# Altium footprint library Mi Libreria.PcbLib: 184 footprints (part 7 of 12)
Each footprint in its own frame and in the unit in brackets; x right, y up, seen from the top. Pads: shape width x height; smd on the part's side, far side on the other; paste and mask are expansions set on the pad; w line width, h text height; cw(c..) or ccw(c..) is an arc to the next point about the centre after c.
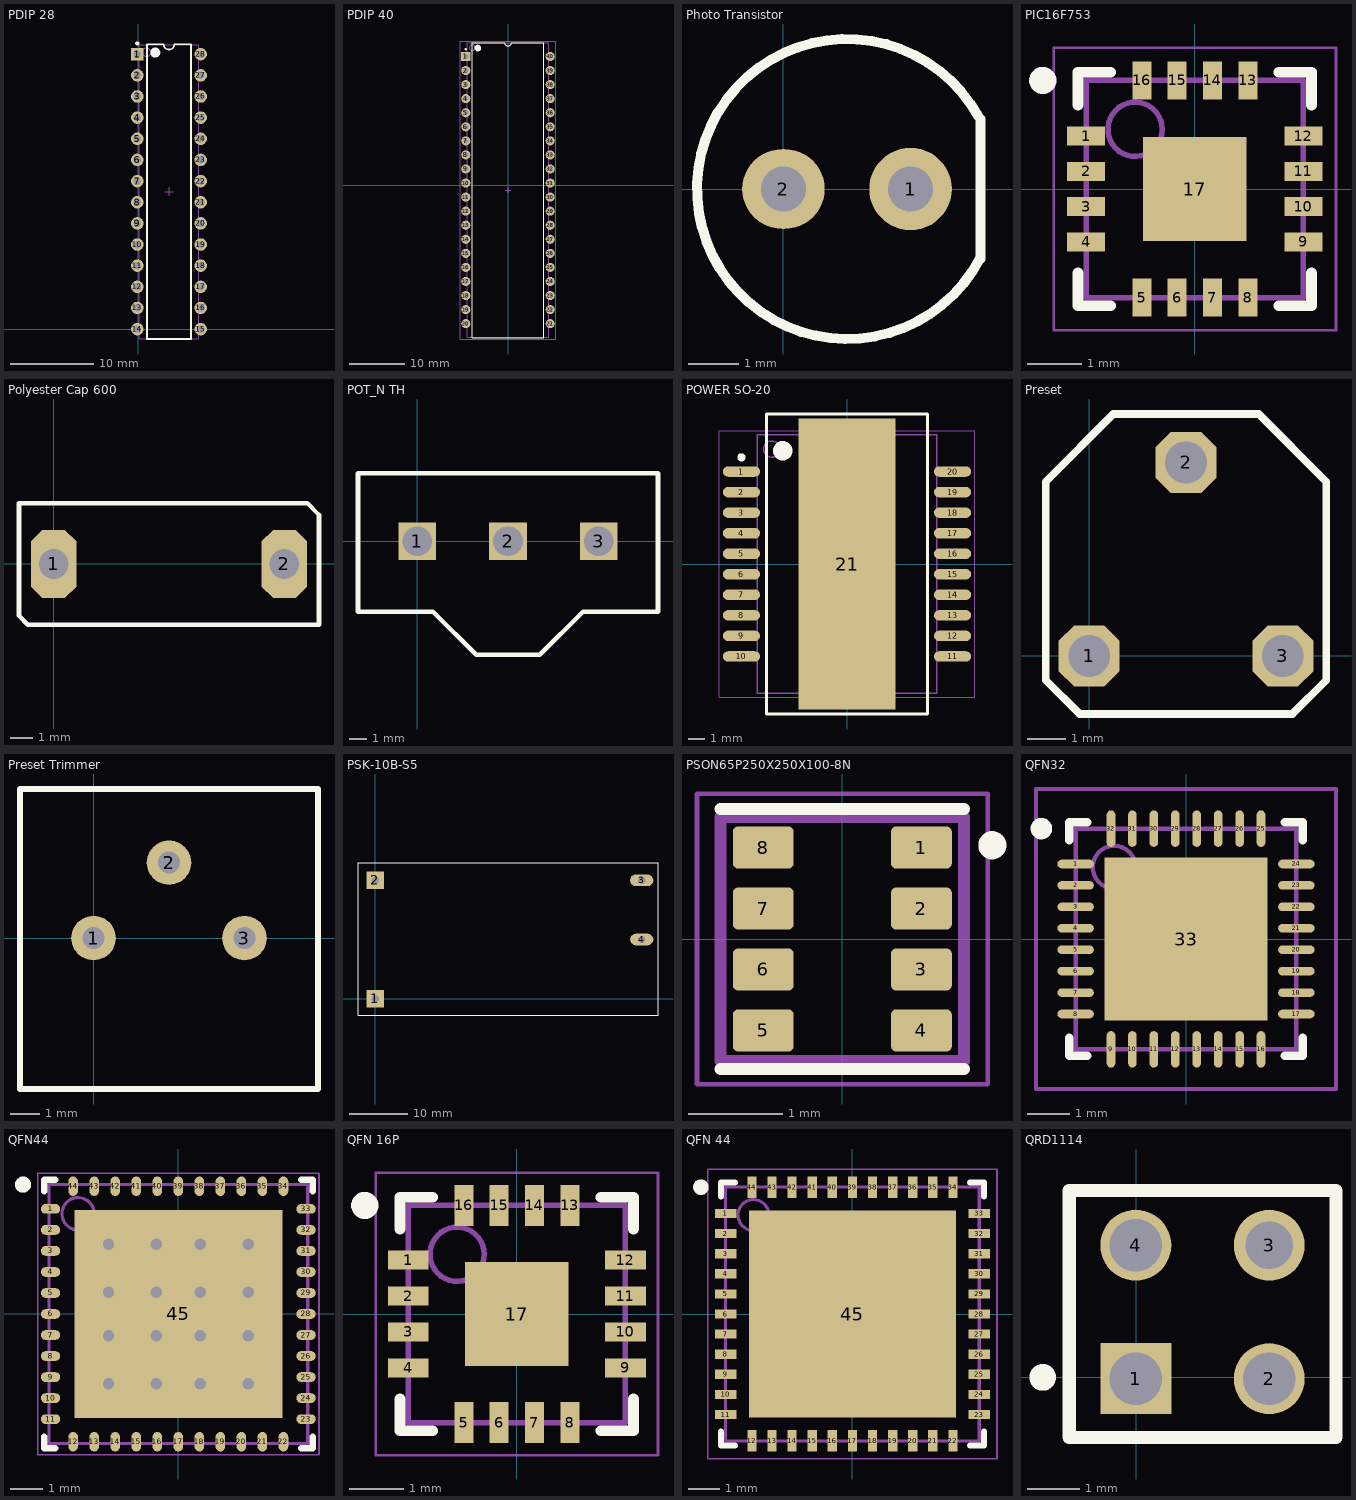
[diagram p6: the footprints below, top view; thin cyan lines are the x and y axes]

## PDIP 28 [mm] "PDIP 28 Through Hole"
pads (28):
  rect 1.5x1.5 hole 0.9: 1(-0.127,33.02)
  round 1.5 hole 0.9: 2(-0.127,30.48) 3(-0.127,27.94) 4(-0.127,25.4) 5(-0.127,22.86) 6(-0.127,20.32) 7(-0.127,17.78) 8(-0.127,15.24) 9(-0.127,12.7) 10(-0.127,10.16) 11(-0.127,7.62) 12(-0.127,5.08) 13(-0.127,2.54) 14(-0.127,0) 15(7.493,0) 16(7.493,2.54) 17(7.493,5.08) 18(7.493,7.62) 19(7.493,10.16) 20(7.493,12.7) 21(7.493,15.24) 22(7.493,17.78) 23(7.493,20.32) 24(7.493,22.86) 25(7.493,25.4) 26(7.493,27.94) 27(7.493,30.48) 28(7.493,33.02)
Top Overlay:
  circle w0.25: c-0.127,34.32 r0.125
  circle w0.6: c2.033,33.21 r0.3
  lines w0.2: 1.033,-1.19 1.033,34.21 3.048,34.21 ccw(c3.683,34.21) 4.318,34.21 6.333,34.21 6.333,-1.19 1.033,-1.19
Mechanical 13:
  circle w0.1: c0.983,33.26 r0.5
  lines w0.1: 0.083,-1.14 0.083,34.16 7.283,34.16 7.283,-1.14 0.083,-1.14
Mechanical 15:
  lines w0.1: 3.183,16.51 4.183,16.51 ; 3.683,16.01 3.683,17.01
3D body "28PDIP.step": height 4.65, standoff -1.57, extent -0.254,-1.461 7.62,34.481

## PDIP 40 [mm] "PDIP 40 IC Socket"
pads (40):
  rect 1.65x1.65 hole 0.9: 1(-7.62,23.241)
  round 1.65 hole 0.9: 2(-7.62,20.701) 3(-7.62,18.161) 4(-7.62,15.621) 5(-7.62,13.081) 6(-7.62,10.541) 7(-7.62,8.001) 8(-7.62,5.461) 9(-7.62,2.921) 10(-7.62,0.381) 11(-7.62,-2.159) 12(-7.62,-4.699) 13(-7.62,-7.239) 14(-7.62,-9.779) 15(-7.62,-12.319) 16(-7.62,-14.859) 17(-7.62,-17.399) 18(-7.62,-19.939) 19(-7.62,-22.479) 20(-7.62,-25.019) 21(7.62,-25.019) 22(7.62,-22.479) 23(7.62,-19.939) 24(7.62,-17.399) 25(7.62,-14.859) 26(7.62,-12.319) 27(7.62,-9.779) 28(7.62,-7.239) 29(7.62,-4.699) 30(7.62,-2.159) 31(7.62,0.381) 32(7.62,2.921) 33(7.62,5.461) 34(7.62,8.001) 35(7.62,10.541) 36(7.62,13.081) 37(7.62,15.621) 38(7.62,18.161) 39(7.62,20.701) 40(7.62,23.241)
Top Overlay:
  circle w0.6: c-5.45,24.761 r0.3
  circle w0.25: c-7.62,24.541 r0.125
  lines w0.2: -6.45,-27.539 6.45,-27.539 6.45,25.761 0.635,25.761 cw(c0,25.761) -0.635,25.761 -6.45,25.761 -6.45,-27.539
Mechanical 13:
  circle w0.1: c-6.475,24.811 r0.5
  lines w0.1: -7.375,-27.489 7.375,-27.489 7.375,25.711 -7.375,25.711 -7.375,-27.489
Mechanical 15:
  lines w0.05: -8.65,-27.789 8.65,-27.789 8.65,26.011 -8.65,26.011 -8.65,-27.789
  lines w0.1: -0.5,-0.889 0.5,-0.889 ; 0,-1.389 0,-0.389
3D body "40 PDIP SOCKET.STEP": height 4.47, standoff -2.9, extent -8.85,-26.289 8.85,24.511
3D body: height 0, standoff -1.6, extent 7.485,22.881 7.755,23.601
3D body: height 3.51, standoff 3.23, extent 7.375,22.741 7.755,23.741
3D body: height 3.24, standoff 0, extent 7.485,22.741 7.755,23.741
3D body: height 0, standoff -1.6, extent 7.485,20.341 7.755,21.061
3D body: height 3.51, standoff 3.23, extent 7.375,20.201 7.755,21.201
3D body: height 3.24, standoff 0, extent 7.485,20.201 7.755,21.201
3D body: height 0, standoff -1.6, extent 7.485,17.801 7.755,18.521
3D body: height 3.51, standoff 3.23, extent 7.375,17.661 7.755,18.661
3D body: height 3.24, standoff 0, extent 7.485,17.661 7.755,18.661
3D body: height 0, standoff -1.6, extent 7.485,15.261 7.755,15.981
3D body: height 3.51, standoff 3.23, extent 7.375,15.121 7.755,16.121
3D body: height 3.24, standoff 0, extent 7.485,15.121 7.755,16.121
3D body: height 0, standoff -1.6, extent 7.485,12.721 7.755,13.441
3D body: height 3.51, standoff 3.23, extent 7.375,12.581 7.755,13.581
3D body: height 3.24, standoff 0, extent 7.485,12.581 7.755,13.581
3D body: height 0, standoff -1.6, extent 7.485,10.181 7.755,10.901
3D body: height 3.51, standoff 3.23, extent 7.375,10.041 7.755,11.041
3D body: height 3.24, standoff 0, extent 7.485,10.041 7.755,11.041
3D body: height 0, standoff -1.6, extent 7.485,7.641 7.755,8.361
3D body: height 3.51, standoff 3.23, extent 7.375,7.501 7.755,8.501
3D body: height 3.24, standoff 0, extent 7.485,7.501 7.755,8.501
3D body: height 0, standoff -1.6, extent 7.485,5.101 7.755,5.821
3D body: height 3.51, standoff 3.23, extent 7.375,4.961 7.755,5.961
3D body: height 3.24, standoff 0, extent 7.485,4.961 7.755,5.961
3D body: height 0, standoff -1.6, extent 7.485,2.561 7.755,3.281
3D body: height 3.51, standoff 3.23, extent 7.375,2.421 7.755,3.421
3D body: height 3.24, standoff 0, extent 7.485,2.421 7.755,3.421
3D body: height 0, standoff -1.6, extent 7.485,0.021 7.755,0.741
3D body: height 3.51, standoff 3.23, extent 7.375,-0.119 7.755,0.881
3D body: height 3.24, standoff 0, extent 7.485,-0.119 7.755,0.881
3D body: height 0, standoff -1.6, extent 7.485,-2.519 7.755,-1.799
3D body: height 3.51, standoff 3.23, extent 7.375,-2.659 7.755,-1.659
3D body: height 3.24, standoff 0, extent 7.485,-2.659 7.755,-1.659
3D body: height 0, standoff -1.6, extent 7.485,-5.059 7.755,-4.339
3D body: height 3.51, standoff 3.23, extent 7.375,-5.199 7.755,-4.199
3D body: height 3.24, standoff 0, extent 7.485,-5.199 7.755,-4.199
3D body: height 0, standoff -1.6, extent 7.485,-7.599 7.755,-6.879
3D body: height 3.51, standoff 3.23, extent 7.375,-7.739 7.755,-6.739
3D body: height 3.24, standoff 0, extent 7.485,-7.739 7.755,-6.739
3D body: height 0, standoff -1.6, extent 7.485,-10.139 7.755,-9.419
3D body: height 3.51, standoff 3.23, extent 7.375,-10.279 7.755,-9.279
3D body: height 3.24, standoff 0, extent 7.485,-10.279 7.755,-9.279
3D body: height 0, standoff -1.6, extent 7.485,-12.679 7.755,-11.959
3D body: height 3.51, standoff 3.23, extent 7.375,-12.819 7.755,-11.819
3D body: height 3.24, standoff 0, extent 7.485,-12.819 7.755,-11.819
3D body: height 0, standoff -1.6, extent 7.485,-15.219 7.755,-14.499
3D body: height 3.51, standoff 3.23, extent 7.375,-15.359 7.755,-14.359
3D body: height 3.24, standoff 0, extent 7.485,-15.359 7.755,-14.359
3D body: height 0, standoff -1.6, extent 7.485,-17.759 7.755,-17.039
3D body: height 3.51, standoff 3.23, extent 7.375,-17.899 7.755,-16.899
3D body: height 3.24, standoff 0, extent 7.485,-17.899 7.755,-16.899
3D body: height 0, standoff -1.6, extent 7.485,-20.299 7.755,-19.579
3D body: height 3.51, standoff 3.23, extent 7.375,-20.439 7.755,-19.439
3D body: height 3.24, standoff 0, extent 7.485,-20.439 7.755,-19.439
3D body: height 0, standoff -1.6, extent 7.485,-22.839 7.755,-22.119
3D body: height 3.51, standoff 3.23, extent 7.375,-22.979 7.755,-21.979
3D body: height 3.24, standoff 0, extent 7.485,-22.979 7.755,-21.979
3D body: height 0, standoff -1.6, extent 7.485,-25.379 7.755,-24.659
3D body: height 3.51, standoff 3.23, extent 7.375,-25.519 7.755,-24.519
3D body: height 3.24, standoff 0, extent 7.485,-25.519 7.755,-24.519
3D body: height 0, standoff -1.6, extent -7.755,-25.379 -7.485,-24.659
3D body: height 3.51, standoff 3.23, extent -7.755,-25.519 -7.375,-24.519
3D body: height 3.24, standoff 0, extent -7.755,-25.519 -7.485,-24.519
3D body: height 0, standoff -1.6, extent -7.755,-22.839 -7.485,-22.119
3D body: height 3.51, standoff 3.23, extent -7.755,-22.979 -7.375,-21.979
3D body: height 3.24, standoff 0, extent -7.755,-22.979 -7.485,-21.979
3D body: height 0, standoff -1.6, extent -7.755,-20.299 -7.485,-19.579
3D body: height 3.51, standoff 3.23, extent -7.755,-20.439 -7.375,-19.439
3D body: height 3.24, standoff 0, extent -7.755,-20.439 -7.485,-19.439
3D body: height 0, standoff -1.6, extent -7.755,-17.759 -7.485,-17.039
3D body: height 3.51, standoff 3.23, extent -7.755,-17.899 -7.375,-16.899
3D body: height 3.24, standoff 0, extent -7.755,-17.899 -7.485,-16.899
3D body: height 0, standoff -1.6, extent -7.755,-15.219 -7.485,-14.499
3D body: height 3.51, standoff 3.23, extent -7.755,-15.359 -7.375,-14.359
3D body: height 3.24, standoff 0, extent -7.755,-15.359 -7.485,-14.359
3D body: height 0, standoff -1.6, extent -7.755,-12.679 -7.485,-11.959
3D body: height 3.51, standoff 3.23, extent -7.755,-12.819 -7.375,-11.819
3D body: height 3.24, standoff 0, extent -7.755,-12.819 -7.485,-11.819
3D body: height 0, standoff -1.6, extent -7.755,-10.139 -7.485,-9.419
3D body: height 3.51, standoff 3.23, extent -7.755,-10.279 -7.375,-9.279
3D body: height 3.24, standoff 0, extent -7.755,-10.279 -7.485,-9.279
3D body: height 0, standoff -1.6, extent -7.755,-7.599 -7.485,-6.879
3D body: height 3.51, standoff 3.23, extent -7.755,-7.739 -7.375,-6.739
3D body: height 3.24, standoff 0, extent -7.755,-7.739 -7.485,-6.739
3D body: height 0, standoff -1.6, extent -7.755,-5.059 -7.485,-4.339
3D body: height 3.51, standoff 3.23, extent -7.755,-5.199 -7.375,-4.199
3D body: height 3.24, standoff 0, extent -7.755,-5.199 -7.485,-4.199
3D body: height 0, standoff -1.6, extent -7.755,-2.519 -7.485,-1.799
3D body: height 3.51, standoff 3.23, extent -7.755,-2.659 -7.375,-1.659
3D body: height 3.24, standoff 0, extent -7.755,-2.659 -7.485,-1.659
3D body: height 0, standoff -1.6, extent -7.755,0.021 -7.485,0.741
3D body: height 3.51, standoff 3.23, extent -7.755,-0.119 -7.375,0.881
3D body: height 3.24, standoff 0, extent -7.755,-0.119 -7.485,0.881
3D body: height 0, standoff -1.6, extent -7.755,2.561 -7.485,3.281
3D body: height 3.51, standoff 3.23, extent -7.755,2.421 -7.375,3.421
3D body: height 3.24, standoff 0, extent -7.755,2.421 -7.485,3.421
3D body: height 0, standoff -1.6, extent -7.755,5.101 -7.485,5.821
3D body: height 3.51, standoff 3.23, extent -7.755,4.961 -7.375,5.961
3D body: height 3.24, standoff 0, extent -7.755,4.961 -7.485,5.961
3D body: height 0, standoff -1.6, extent -7.755,7.641 -7.485,8.361
3D body: height 3.51, standoff 3.23, extent -7.755,7.501 -7.375,8.501
3D body: height 3.24, standoff 0, extent -7.755,7.501 -7.485,8.501
3D body: height 0, standoff -1.6, extent -7.755,10.181 -7.485,10.901
3D body: height 3.51, standoff 3.23, extent -7.755,10.041 -7.375,11.041
3D body: height 3.24, standoff 0, extent -7.755,10.041 -7.485,11.041
3D body: height 0, standoff -1.6, extent -7.755,12.721 -7.485,13.441
3D body: height 3.51, standoff 3.23, extent -7.755,12.581 -7.375,13.581
3D body: height 3.24, standoff 0, extent -7.755,12.581 -7.485,13.581
3D body: height 0, standoff -1.6, extent -7.755,15.261 -7.485,15.981
3D body: height 3.51, standoff 3.23, extent -7.755,15.121 -7.375,16.121
3D body: height 3.24, standoff 0, extent -7.755,15.121 -7.485,16.121
3D body: height 0, standoff -1.6, extent -7.755,17.801 -7.485,18.521
3D body: height 3.51, standoff 3.23, extent -7.755,17.661 -7.375,18.661
3D body: height 3.24, standoff 0, extent -7.755,17.661 -7.485,18.661
3D body: height 0, standoff -1.6, extent -7.755,20.341 -7.485,21.061
3D body: height 3.51, standoff 3.23, extent -7.755,20.201 -7.375,21.201
3D body: height 3.24, standoff 0, extent -7.755,20.201 -7.485,21.201
3D body: height 0, standoff -1.6, extent -7.755,22.881 -7.485,23.601
3D body: height 3.51, standoff 3.23, extent -7.755,22.741 -7.375,23.741
3D body: height 3.24, standoff 0, extent -7.755,22.741 -7.485,23.741
3D body "PDIP-40.step": height 8.96, standoff 1.6, extent -7.765,-27.051 7.765,25.209

## Photo Transistor [mm] "5mm TH"
pads (2):
  round 1.65 hole 0.9: 1(2.54,0)
  oval 1.65x1.6 hole 0.9: 2(0,0)
Top Overlay:
  lines w0.2: 3.892,1.457 ccw(c1.27,0) 3.925,-1.397 ; 3.937,-1.397 3.937,1.397
3D body "LED 5mm AZUL.STEP": height 10.31, standoff -4.49, extent -1.71,-3.01 3.71,3.01

## PIC16F753 [mm] "QFN 16P"
height 1
pads (17):
  rect 0.7x0.35 smd: 1(-2,0.975) 2(-2,0.325) 3(-2,-0.325) 4(-2,-0.975) 9(2,-0.975) 10(2,-0.325) 11(2,0.325) 12(2,0.975)
  rect 0.35x0.7 smd: 5(-0.975,-2) 6(-0.325,-2) 7(0.325,-2) 8(0.975,-2) 13(0.975,2) 14(0.325,2) 15(-0.325,2) 16(-0.975,2)
  rect 1.91x1.91 smd: 17(0,0)
Top Overlay:
  circle w0.25: c-2.8,2 r0.125
  lines w0.2: -2.15,-1.55 -2.15,-2.15 -1.55,-2.15 ; -2.15,1.55 -2.15,2.15 -1.55,2.15 ; 1.55,-2.15 2.15,-2.15 2.15,-1.55 ; 1.55,2.15 2.15,2.15 2.15,1.55
Mechanical 13:
  circle w0.1: c-1.1,1.1 r0.5
  lines w0.1: -2,-2 -2,2 2,2 2,-2 -2,-2
Mechanical 15:
  lines w0.05: -2.6,-2.6 -2.6,2.6 2.6,2.6 2.6,-2.6 -2.6,-2.6
  lines w0.1: -0.5,0 0.5,0 ; 0,-0.5 0,0.5
3D body: height 1, standoff 0.01, extent -2,-2 2,2

## Polyester Cap 600 [mm] "Cpacitor Poliester 600VAC"
pads (2):
  oct 2x3 hole 1.3: 1(0,0) 2(10.16,0)
Top Overlay:
  lines w0.2: -1.524,-2.286 -1.524,2.667 11.176,2.667 11.684,2.159 11.684,-2.667 -1.143,-2.667 -1.524,-2.286
3D body "Poly Capacitor F.step": height 11.92, standoff -2, extent -1.295,-2.375 11.455,2.376

## POT_N TH [mm] "POTENCIOMETRO ESTANDAR TROUGH HOLE"
pads (3):
  rect 2.1x2.1 hole 1.65: 1(0,0) 2(5.08,0) 3(10.16,0)
Top Overlay:
  lines w0.254: -3.302,-3.937 0.889,-3.937 3.302,-6.35 6.858,-6.35 9.271,-3.937 13.462,-3.937 13.462,3.81 -3.302,3.81 -3.302,-3.937
3D body "POTN.STEP": height 22.3, standoff -2.9, extent -3.402,-18.425 13.562,5.775

## POWER SO-20 [mm] "SOP, 20-Leads, Body 15.90x11.00mm, Pitch 1.27mm, Thermal Pad 9.80.2x6.20.2mm, IPC Medium Density"
height 2.65
pads (21):
  oval 2.3x0.65 smd: 1(-6.525,5.715) 2(-6.525,4.445) 3(-6.525,3.175) 4(-6.525,1.905) 5(-6.525,0.635) 6(-6.525,-0.635) 7(-6.525,-1.905) 8(-6.525,-3.175) 9(-6.525,-4.445) 10(-6.525,-5.715) 11(6.525,-5.715) 12(6.525,-4.445) 13(6.525,-3.175) 14(6.525,-1.905) 15(6.525,-0.635) 16(6.525,0.635) 17(6.525,1.905) 18(6.525,3.175) 19(6.525,4.445) 20(6.525,5.715)
  rect 6x18 smd: 21(0,0)
Top Overlay:
  circle w0.25: c-6.525,6.59 r0.125
  circle w0.6: c-3.975,7 r0.3
  lines w0.2: -4.975,-9.271 -4.975,9.271 4.975,9.271 4.975,-9.271 -4.975,-9.271
Mechanical 13:
  circle w0.1: c-4.65,7.1 r0.5
  lines w0.1: -5.55,-8 -5.55,8 5.55,8 5.55,-8 -5.55,-8
Mechanical 15:
  lines w0.05: -7.9,-8.25 -7.9,8.25 7.9,8.25 7.9,-8.25 -7.9,-8.25
  lines w0.1: -0.5,0 0.5,0 ; 0,-0.5 0,0.5
3D body "User Library-PowerSO20.STEP": height 3.6, standoff 0, extent -7.034,-8 7.366,8

## Preset [mm] "Potenciometro Tipo Preset"
pads (3):
  oct 1.6x1.6 hole 1.1: 1(0,0) 2(2.54,5.08) 3(5.08,0)
Top Overlay:
  lines w0.2: -1.143,-0.635 -1.143,0.635 -1.143,4.572 0.635,6.35 4.445,6.35 6.223,4.572 6.223,0.635 6.223,-0.635 5.334,-1.524 -0.254,-1.524 -1.143,-0.635
3D body "PRESET.step": height 8, standoff -2.9, extent -0.674,-1.415 5.826,5.635

## Preset Trimmer [mm] "Potenciometro Tipo Trimmer"
pads (3):
  round 1.5 hole 0.75: 1(0,0) 2(2.54,2.54) 3(5.08,0)
Top Overlay:
  lines w0.2: -2.476,-5.08 -2.476,1.968 -2.476,5.016 7.556,5.016 7.556,4.127 7.556,-5.08 -2.476,-5.08
3D body "TRIMMER SINGLE TURN 10MM 500MW TOP ADJUST.step": height 6, standoff -3.83, extent -2.225,-4.763 7.305,4.767

## PSK-10B-S5 [mm] "Power Supply AC-DC 10W"
pads (4):
  rect 3x3 hole 1.3: 1(0,0) 2(0,20.32)
  oval 4x2 hole 1.25: 3(45.72,20.32) 4(45.72,10.16)
Top Overlay:
  lines w0.2: -2.984,-2.794 -2.984,23.304 48.514,23.304 48.514,-2.794 -2.984,-2.794
3D body "CUI_PSK-10B-S5.step": height 21.05, standoff -5.5, extent -2.603,-2.476 48.197,22.924

## PSON65P250X250X100-8N [mm]
pads (8):
  rrect25% 0.65x0.45 smd: 1(0.843,0.975) 2(0.843,0.325) 3(0.843,-0.325) 4(0.843,-0.975) 5(-0.843,-0.975) 6(-0.843,-0.325) 7(-0.843,0.325) 8(-0.843,0.975)
Top Overlay:
  circle w0.2: c1.6,1 r0.05
  lines w0.127: -1.3,-1.385 1.3,-1.385 ; -1.3,1.385 1.3,1.385
Mechanical 13:
  circle w0.2: c1,1 r0.05
  lines w0.127: -1.3,-1.3 1.3,-1.3 1.3,1.3 -1.3,1.3 -1.3,-1.3
Mechanical 15:
  lines w0.05: -1.55,-1.55 -1.55,1.55 1.55,1.55 1.55,-1.55 -1.55,-1.55
3D body "BMP 280.STEP": height 1, standoff -0.02, extent -0.964,-1.304 1.016,1.177

## QFN32 [mm] "QFN 32 5X5mm"
pads (33):
  oval 0.85x0.2 smd: 1(-2.575,1.75) 2(-2.575,1.25) 3(-2.575,0.75) 4(-2.575,0.25) 5(-2.575,-0.25) 6(-2.575,-0.75) 7(-2.575,-1.25) 8(-2.575,-1.75) 17(2.575,-1.75) 18(2.575,-1.25) 19(2.575,-0.75) 20(2.575,-0.25) 21(2.575,0.25) 22(2.575,0.75) 23(2.575,1.25) 24(2.575,1.75)
  oval 0.2x0.85 smd: 9(-1.75,-2.575) 10(-1.25,-2.575) 11(-0.75,-2.575) 12(-0.25,-2.575) 13(0.25,-2.575) 14(0.75,-2.575) 15(1.25,-2.575) 16(1.75,-2.575) 25(1.75,2.575) 26(1.25,2.575) 27(0.75,2.575) 28(0.25,2.575) 29(-0.25,2.575) 30(-0.75,2.575) 31(-1.25,2.575) 32(-1.75,2.575)
  rect 3.8x3.8 smd: 33(0,0)
Top Overlay:
  circle w0.25: c-3.375,2.575 r0.125
  lines w0.2: -2.725,-2.3 -2.725,-2.725 -2.3,-2.725 ; -2.725,2.3 -2.725,2.725 -2.3,2.725 ; 2.3,-2.725 2.725,-2.725 2.725,-2.3 ; 2.3,2.725 2.725,2.725 2.725,2.3
Mechanical 13:
  circle w0.1: c-1.675,1.675 r0.5
  lines w0.1: -2.575,-2.575 2.575,-2.575 2.575,2.575 -2.575,2.575 -2.575,-2.575
Mechanical 15:
  lines w0.1: -0.5,0 0.5,0 ; 0,-0.5 0,0.5 ; -3.5,-3.5 3.5,-3.5 3.5,3.5 -3.5,3.5 -3.5,-3.5
3D body "QFN-32UH.step": height 0.75, standoff 0, extent -2.51,-2.51 2.51,2.51

## QFN44 [mm] "QFN, 44-Leads, Body 8x8mm, Pitch 0.65mm, Thermal Pad 6.425x6.425mm, IPC High Density"
pads (45):
  oval 0.6x0.3 smd: 1(-3.95,3.25) 2(-3.95,2.6) 3(-3.95,1.95) 4(-3.95,1.3) 5(-3.95,0.65) 6(-3.95,0) 7(-3.95,-0.65) 8(-3.95,-1.3) 9(-3.95,-1.95) 10(-3.95,-2.6) 11(-3.95,-3.25) 23(3.95,-3.25) 24(3.95,-2.6) 25(3.95,-1.95) 26(3.95,-1.3) 27(3.95,-0.65) 28(3.95,0) 29(3.95,0.65) 30(3.95,1.3) 31(3.95,1.95) 32(3.95,2.6) 33(3.95,3.25)
  oval 0.3x0.6 smd: 12(-3.25,-3.95) 13(-2.6,-3.95) 14(-1.95,-3.95) 15(-1.3,-3.95) 16(-0.65,-3.95) 17(0,-3.95) 18(0.65,-3.95) 19(1.3,-3.95) 20(1.95,-3.95) 21(2.6,-3.95) 22(3.25,-3.95) 34(3.25,3.95) 35(2.6,3.95) 36(1.95,3.95) 37(1.3,3.95) 38(0.65,3.95) 39(0,3.95) 40(-0.65,3.95) 41(-1.3,3.95) 42(-1.95,3.95) 43(-2.6,3.95) 44(-3.25,3.95)
  rect 6.43x6.43 smd: 45(0,0)
via -2.158,2.158 diameter 0.5 hole 0.35
via -0.677,2.158 diameter 0.5 hole 0.35
via 0.677,2.158 diameter 0.5 hole 0.35
via 2.158,2.158 diameter 0.5 hole 0.35
via -2.158,0.677 diameter 0.5 hole 0.35
via -0.677,0.677 diameter 0.5 hole 0.35
via 0.677,0.677 diameter 0.5 hole 0.35
via 2.158,0.677 diameter 0.5 hole 0.35
via -2.158,-0.677 diameter 0.5 hole 0.35
via -0.677,-0.677 diameter 0.5 hole 0.35
via 0.677,-0.677 diameter 0.5 hole 0.35
via 2.158,-0.677 diameter 0.5 hole 0.35
via -2.158,-2.158 diameter 0.5 hole 0.35
via -0.677,-2.158 diameter 0.5 hole 0.35
via 0.677,-2.158 diameter 0.5 hole 0.35
via 2.158,-2.158 diameter 0.5 hole 0.35
Top Overlay:
  circle w0.25: c-4.8,4 r0.125
  lines w0.2: -4.15,-3.8 -4.15,-4.15 -3.8,-4.15 ; -4.15,3.8 -4.15,4.15 -3.8,4.15 ; 3.8,-4.15 4.15,-4.15 4.15,-3.8 ; 3.8,4.15 4.15,4.15 4.15,3.8
Mechanical 13:
  circle w0.1: c-3.1,3.1 r0.5
  lines w0.1: -4,-4 -4,4 4,4 4,-4 -4,-4
Mechanical 15:
  lines w0.05: -4.35,-4.35 -4.35,4.35 4.35,4.35 4.35,-4.35 -4.35,-4.35
  lines w0.1: -0.5,0 0.5,0 ; 0,-0.5 0,0.5
3D body "QFN44_8x8.step": height 0.88, standoff -0.02, extent -4.01,-4.01 4.01,4.01

## QFN 16P [mm] "QFN ADXL326"
height 1
pads (17):
  rect 0.75x0.35 smd: 1(-2,0.99) 2(-2,0.33) 3(-2,-0.33) 4(-2,-0.99) 9(2,-0.99) 10(2,-0.33) 11(2,0.33) 12(2,0.99)
  rect 0.35x0.75 smd: 5(-0.975,-2) 6(-0.325,-2) 7(0.325,-2) 8(0.975,-2) 13(0.975,2) 14(0.325,2) 15(-0.325,2) 16(-0.975,2)
  rect 1.91x1.91 smd: 17(0,0)
Top Overlay:
  circle w0.25: c-2.8,2 r0.125
  lines w0.2: -2.15,-1.565 -2.15,-2.15 -1.55,-2.15 ; -2.15,1.565 -2.15,2.15 -1.55,2.15 ; 1.55,-2.15 2.15,-2.15 2.15,-1.565 ; 1.55,2.15 2.15,2.15 2.15,1.565
Mechanical 13:
  circle w0.1: c-1.1,1.1 r0.5
  lines w0.1: -2,-2 2,-2 2,2 -2,2 -2,-2
Mechanical 15:
  lines w0.05: -2.6,-2.6 2.6,-2.6 2.6,2.6 -2.6,2.6 -2.6,-2.6
  lines w0.1: -0.5,0 0.5,0 ; 0,-0.5 0,0.5
3D body: height 1, standoff 0.01, extent -2,-2 2,2

## QFN 44 [mm] "D B P"
height 1
pads (45):
  rect 0.7x0.3 smd: 1(-4.1,3.25) 2(-4.1,2.6) 3(-4.1,1.95) 4(-4.1,1.3) 5(-4.1,0.65) 6(-4.1,0) 7(-4.1,-0.65) 8(-4.1,-1.3) 9(-4.1,-1.95) 10(-4.1,-2.6) 11(-4.1,-3.25) 23(4.1,-3.25) 24(4.1,-2.6) 25(4.1,-1.95) 26(4.1,-1.3) 27(4.1,-0.65) 28(4.1,0) 29(4.1,0.65) 30(4.1,1.3) 31(4.1,1.95) 32(4.1,2.6) 33(4.1,3.25)
  rect 0.3x0.7 smd: 12(-3.25,-4.1) 13(-2.6,-4.1) 14(-1.95,-4.1) 15(-1.3,-4.1) 16(-0.65,-4.1) 17(0,-4.1) 18(0.65,-4.1) 19(1.3,-4.1) 20(1.95,-4.1) 21(2.6,-4.1) 22(3.25,-4.1) 34(3.25,4.1) 35(2.6,4.1) 36(1.95,4.1) 37(1.3,4.1) 38(0.65,4.1) 39(0,4.1) 40(-0.65,4.1) 41(-1.3,4.1) 42(-1.95,4.1) 43(-2.6,4.1) 44(-3.25,4.1)
  rect 6.7x6.7 smd: 45(0,0)
Top Overlay:
  circle w0.25: c-4.9,4.1 r0.125
  lines w0.2: -4.25,-3.8 -4.25,-4.25 -3.8,-4.25 ; -4.25,3.8 -4.25,4.25 -3.8,4.25 ; 3.8,-4.25 4.25,-4.25 4.25,-3.8 ; 3.8,4.25 4.25,4.25 4.25,3.8
Mechanical 13:
  circle w0.1: c-3.2,3.2 r0.5
  lines w0.1: -4.1,-4.1 4.1,-4.1 4.1,4.1 -4.1,4.1 -4.1,-4.1
Mechanical 15:
  lines w0.05: -4.675,-4.675 4.675,-4.675 4.675,4.675 -4.675,4.675 -4.675,-4.675
  lines w0.1: -0.5,0 0.5,0 ; 0,-0.5 0,0.5
3D body: height 1, standoff 0.01, extent -4.1,-4.1 4.1,4.1

## QRD1114 [mm] "QRD REFLECTIVE SENSOR"
height 5
pads (4):
  rect 1.35x1.35 hole 1: 1(-0.005,-0.024)
  round 1.35 hole 1: 2(2.535,-0.024) 4(-0.005,2.516)
  round 1.35 hole 0.9: 3(2.535,2.516)
Top Overlay:
  circle w0.254: c-1.778,0 r0.127
  lines w0.254: -1.275,-1.138 -1.27,-1.143 3.805,-1.143 3.805,3.556 -1.27,3.556 -1.275,3.551 -1.275,-1.138
3D body: height 2.5, standoff 0.05, extent -1.27,-1.143 3.81,3.556